# Altium footprint library Components.PcbLib: 260 footprints (part 6 of 17)
Each footprint in its own frame and in the unit in brackets; x right, y up, seen from the top. Pads: shape width x height; smd on the part's side, far side on the other; paste and mask are expansions set on the pad; w line width, h text height; cw(c..) or ccw(c..) is an arc to the next point about the centre after c.
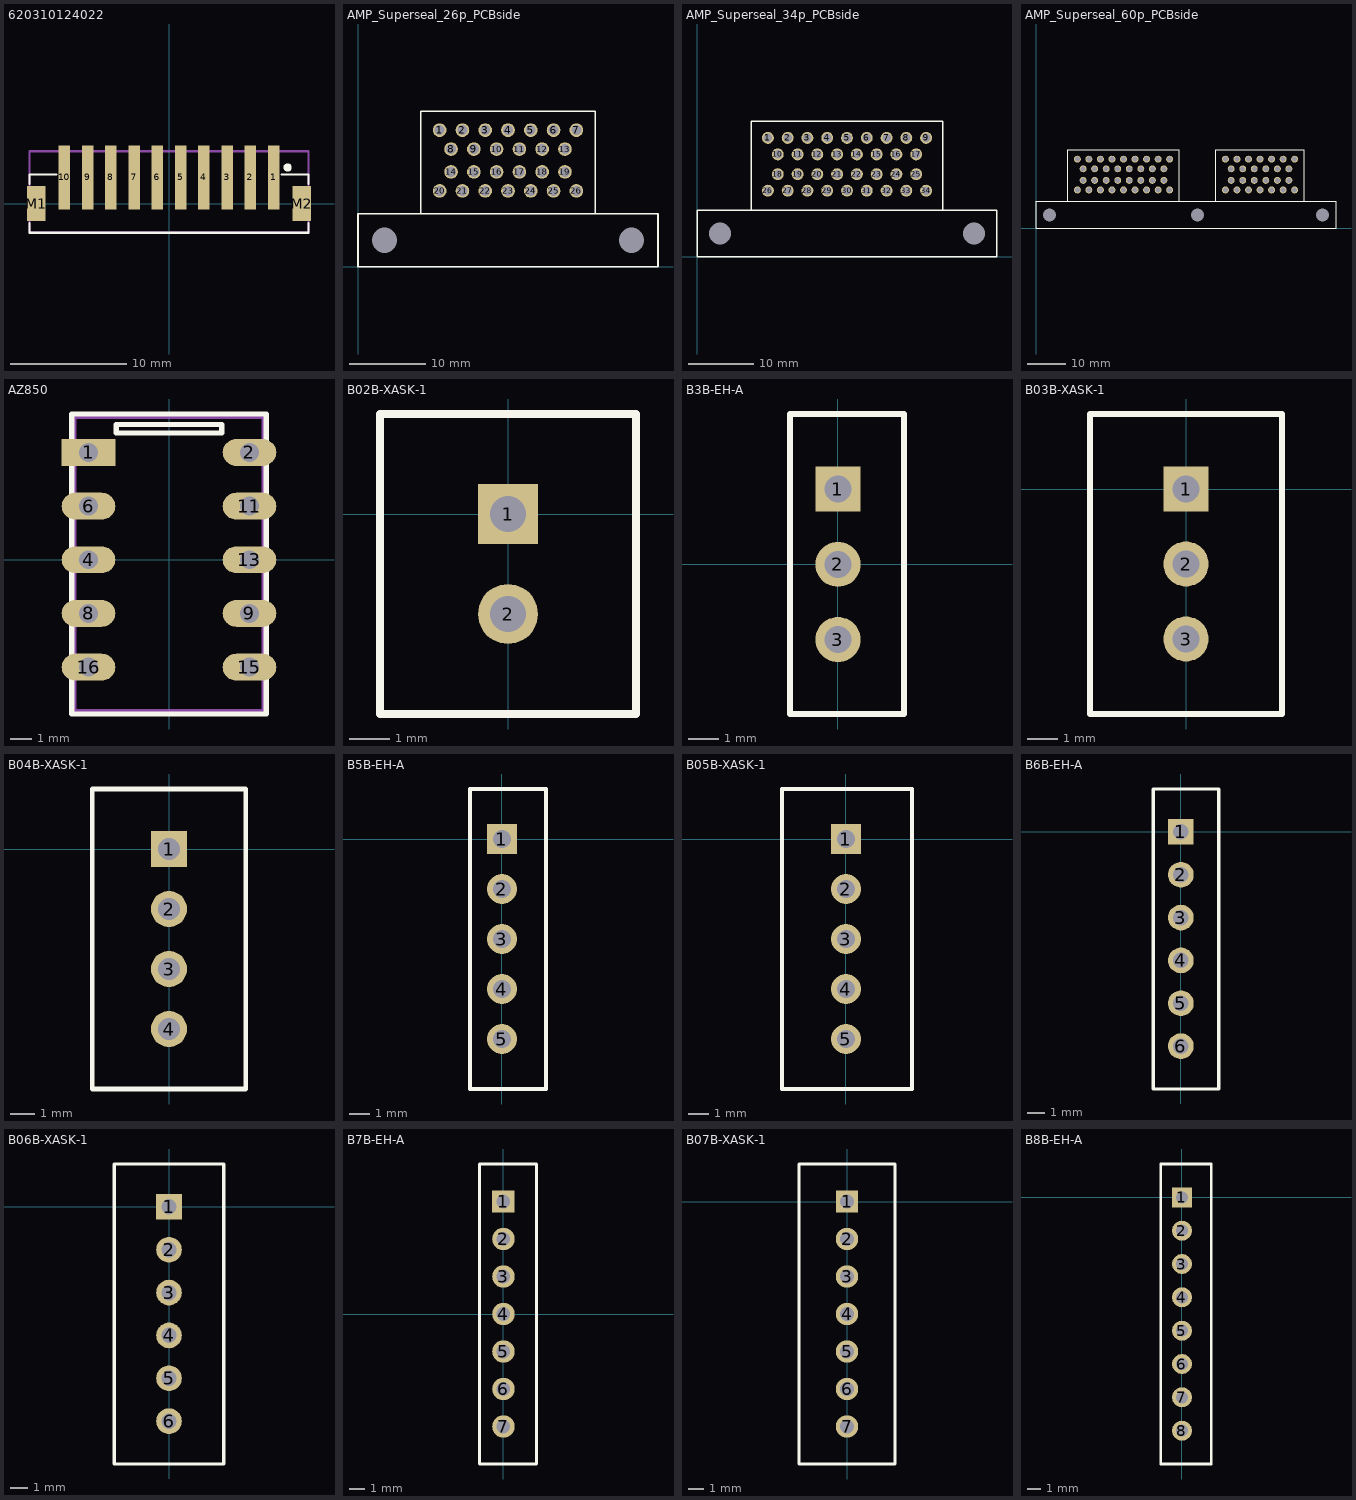
[diagram p5: the footprints below, top view; thin cyan lines are the x and y axes]

## 620310124022 [mm] "2.00mm SMT Male Vertical Shrouded Header, 10p"
height 6.86
pads (12):
  rect 1x5.5 smd: 1(9,2.25) 2(7,2.25) 3(5,2.25) 4(3,2.25) 5(1,2.25) 6(-1,2.25) 7(-3,2.25) 8(-5,2.25) 9(-7,2.25) 10(-9,2.25)
  rect 1.6x3 smd: M1(-11.4,0) M2(11.4,0)
Top Overlay:
  circle w0.5: c10.2,3.1 r0.1
  lines w0.2: -12,-1.7 -12,-2.5 12,-2.5 12,-1.7 ; -12,1.7 -12,2.5 -9.7,2.5 ; 9.7,2.5 12,2.5 12,1.7
Mechanical 13:
  lines w0.2: -12,-2.5 -12,4.5 12,4.5 12,-2.5 -12,-2.5
3D body "620310124022.stp": height 6.75, standoff -0.03, extent -12,-2.5 12,4.51

## AMP_Superseal_26p_PCBside [mm]
pads (28):
  round 1.8 hole 1.3: 1(10.75,18) 2(13.75,18) 3(16.75,18) 4(19.75,18) 5(22.75,18) 6(25.75,18) 7(28.75,18) 8(12.25,15.5) 9(15.25,15.5) 10(18.25,15.5) 11(21.25,15.5) 12(24.25,15.5) 13(27.25,15.5) 14(12.25,12.5) 15(15.25,12.5) 16(18.25,12.5) 17(21.25,12.5) 18(24.25,12.5) 19(27.25,12.5) 20(10.75,10) 21(13.75,10) 22(16.75,10) 23(19.75,10) 24(22.75,10) 25(25.75,10) 26(28.75,10)
  round 0 hole 3.3: MH(3.5,3.5) MH(36,3.5)
Top Overlay:
  lines w0.2: 8.25,7 8.25,20.5 31.25,20.5 31.25,7 ; 0,0 39.5,0 39.5,7 0,7 0,0
3D body "superseal_26p_black.stp": height 27.9, standoff -4, extent 0.025,-16.05 39.525,20.45

## AMP_Superseal_34p_PCBside [mm]
pads (36):
  round 1.8 hole 1.3: 1(10.75,18) 2(13.75,18) 3(16.75,18) 4(19.75,18) 5(22.75,18) 6(25.75,18) 7(28.75,18) 8(31.75,18) 9(34.75,18) 10(12.25,15.5) 11(15.25,15.5) 12(18.25,15.5) 13(21.25,15.5) 14(24.25,15.5) 15(27.25,15.5) 16(30.25,15.5) 17(33.25,15.5) 18(12.25,12.5) 19(15.25,12.5) 20(18.25,12.5) 21(21.25,12.5) 22(24.25,12.5) 23(27.25,12.5) 24(30.25,12.5) 25(33.25,12.5) 26(10.75,10) 27(13.75,10) 28(16.75,10) 29(19.75,10) 30(22.75,10) 31(25.75,10) 32(28.75,10) 33(31.75,10) 34(34.75,10)
  round 0 hole 3.3: MH(3.5,3.5) MH(42,3.5)
Top Overlay:
  lines w0.2: 8.25,7 8.25,20.5 37.25,20.5 37.25,7 ; 0,0 0,7 45.5,7 45.5,0 0,0
3D body "c-6437288-1-c-3d.stp": height 28.17, standoff -3.98, extent 0,-16 45.5,20.5

## AMP_Superseal_60p_PCBside [mm]
pads (63):
  round 1.8 hole 1.3: 1(10.75,18) 2(13.75,18) 3(16.75,18) 4(19.75,18) 5(22.75,18) 6(25.75,18) 7(28.75,18) 8(31.75,18) 9(34.75,18) 10(12.25,15.5) 11(15.25,15.5) 12(18.25,15.5) 13(21.25,15.5) 14(24.25,15.5) 15(27.25,15.5) 16(30.25,15.5) 17(33.25,15.5) 18(12.25,12.5) 19(15.25,12.5) 20(18.25,12.5) 21(21.25,12.5) 22(24.25,12.5) 23(27.25,12.5) 24(30.25,12.5) 25(33.25,12.5) 26(10.75,10) 27(13.75,10) 28(16.75,10) 29(19.75,10) 30(22.75,10) 31(25.75,10) 32(28.75,10) 33(31.75,10) 34(34.75,10) 35(49.25,18) 36(52.25,18) 37(55.25,18) 38(58.25,18) 39(61.25,18) 40(64.25,18) 41(67.25,18) 42(50.75,15.5) 43(53.75,15.5) 44(56.75,15.5) 45(59.75,15.5) 46(62.75,15.5) 47(65.75,15.5) 48(50.75,12.5) 49(53.75,12.5) 50(56.75,12.5) 51(59.75,12.5) 52(62.75,12.5) 53(65.75,12.5) 54(49.25,10) 55(52.25,10) 56(55.25,10) 57(58.25,10) 58(61.25,10) 59(64.25,10) 60(67.25,10)
  round 0 hole 3.3: MH(3.5,3.5) MH(42,3.5) MH(74.5,3.5)
Top Overlay:
  lines w0.2: 8.25,7 8.25,20.5 37.25,20.5 37.25,7 ; 46.75,7 46.75,20.5 69.75,20.5 69.75,7 ; 0,0 0,7 46,7 78,7 78,0 38.5,0 0,0
3D body "c-6437288-3-d-3d.stp": height 28.17, standoff -3.98, extent 0,-16 78,20.5

## AZ850 [mil]
pads (10):
  rect 100x50 hole 35: 1(-150,200)
  oval 100x50 hole 35: 2(150,200) 4(-150,0) 6(-150,100) 8(-150,-100) 9(150,-100) 11(150,100) 13(150,0) 15(150,-200) 16(-150,-200)
Top Overlay:
  lines w10: -181.1,-287.4 -181.1,271.65 181.1,271.65 181.1,-287.4 -181.1,-287.4 ; -98.43,236.22 98.43,236.22 98.43,251.97 -98.43,251.97 -98.43,236.22
Mechanical 1:
  lines w10: -177.17,-283.46 177.17,-283.46 177.17,267.72 -177.17,267.72 -177.17,-283.46
3D body: height 0, standoff -137.8, extent 130.32,-219.66 169.69,-180.33
3D body: height 0, standoff -137.8, extent 130.32,-119.66 169.69,-80.33
3D body: height 0, standoff -137.8, extent 130.32,-19.66 169.69,19.67
3D body: height 0, standoff -137.8, extent 130.32,80.34 169.69,119.67
3D body: height 0, standoff -137.8, extent 130.32,180.34 169.69,219.67
3D body: height 0, standoff -137.8, extent -169.68,-219.66 -130.31,-180.33
3D body: height 0, standoff -137.8, extent -169.68,-119.66 -130.31,-80.33
3D body: height 0, standoff -137.8, extent -169.68,-19.66 -130.31,19.67
3D body: height 0, standoff -137.8, extent -169.68,80.34 -130.31,119.67
3D body: height 0, standoff -137.8, extent -169.68,180.34 -130.31,219.67
3D body: height 196.85, standoff 0, extent -177.17,-283.46 177.17,267.72

## B02B-XASK-1 [mm]
height 8.8
pads (2):
  rect 1.5x1.5 hole 0.9: 1(0,0)
  round 1.5 hole 0.9: 2(0,-2.5)
Top Overlay:
  lines w0.2: -3.2,-5 -3.2,2.5 3.2,2.5 3.2,-5 -3.2,-5
3D body "B02B-XASK-1.STEP": height 8.8, standoff -3.4, extent -3.2,-5 3.2,2.5

## B3B-EH-A [mm]
pads (3):
  rect 1.5x1.5 hole 0.9: 1(0,2.5)
  round 1.5 hole 0.9: 2(0,0) 3(0,-2.5)
Top Overlay:
  lines w0.2: -1.6,-4.975 2.2,-4.975 2.2,5 -1.6,5 -1.6,-4.975

## B03B-XASK-1 [mm]
height 8.8
pads (3):
  rect 1.5x1.5 hole 0.9: 1(0,0)
  round 1.5 hole 0.9: 2(0,-2.5) 3(0,-5)
Top Overlay:
  lines w0.2: -3.2,-7.5 3.2,-7.5 3.2,2.5 -3.2,2.5 -3.2,-7.5
3D body "B03B-XASK-1.STEP": height 8.8, standoff -3.4, extent -3.2,-7.5 3.2,2.5

## B04B-XASK-1 [mm]
height 8.8
pads (4):
  rect 1.5x1.5 hole 0.9: 1(0,0)
  round 1.5 hole 0.9: 2(0,-2.5) 3(0,-5) 4(0,-7.5)
Top Overlay:
  lines w0.2: -3.2,-10 3.2,-10 3.2,2.5 -3.2,2.5 -3.2,-10
3D body "B04B-XASK-1.STEP": height 8.8, standoff -3.4, extent -3.2,-10 3.2,2.5

## B5B-EH-A [mm]
height 8.8
pads (5):
  rect 1.5x1.5 hole 0.9: 1(0,0)
  round 1.5 hole 0.9: 2(0,-2.5) 3(0,-5) 4(0,-7.5) 5(0,-10)
Top Overlay:
  lines w0.2: -1.6,-12.5 2.2,-12.5 2.2,2.5 -1.6,2.5 -1.6,-12.5
3D body "B5B-EH-A.STEP": height 6, standoff -3.2, extent -1.6,-12.5 2.2,2.5

## B05B-XASK-1 [mm]
height 8.8
pads (5):
  rect 1.5x1.5 hole 0.9: 1(0,0)
  round 1.5 hole 0.9: 2(0,-2.5) 3(0,-5) 4(0,-7.5) 5(0,-10)
Top Overlay:
  lines w0.2: -3.2,-12.5 3.302,-12.5 3.302,2.5 -3.2,2.5 -3.2,-12.5
3D body "B05B-XASK-1.STEP": height 2.9, standoff -9.3, extent -3.225,-12.58 3.175,2.42

## B6B-EH-A [mm]
height 8.8
pads (6):
  rect 1.5x1.5 hole 0.9: 1(0,0)
  round 1.5 hole 0.9: 2(0,-2.5) 3(0,-5) 4(0,-7.5) 5(0,-10) 6(0,-12.5)
Top Overlay:
  lines w0.2: -1.6,-15 2.2,-15 2.2,2.5 -1.6,2.5 -1.6,-15
3D body "B6B-EH-A.STEP": height 6, standoff -3.2, extent -1.6,-15 2.2,2.5

## B06B-XASK-1 [mm]
height 8.8
pads (6):
  rect 1.5x1.5 hole 0.9: 1(0,0)
  round 1.5 hole 0.9: 2(0,-2.5) 3(0,-5) 4(0,-7.5) 5(0,-10) 6(0,-12.5)
Top Overlay:
  lines w0.2: -3.2,-15 3.2,-15 3.2,2.5 -3.2,2.5 -3.2,-15
3D body "B06B-XASK-1.STEP": height 8.8, standoff -3.4, extent -3.2,-15 3.2,2.5

## B7B-EH-A [mm]
height 8.8
pads (7):
  rect 1.5x1.5 hole 0.9: 1(0,7.5)
  round 1.5 hole 0.9: 2(0,5) 3(0,2.5) 4(0,0) 5(0,-2.5) 6(0,-5)
  round 1.5 hole 0.9 mask+0.102: 7(0,-7.5)
Top Overlay:
  lines w0.2: -1.6,-10 -1.6,10 2.2,10 2.2,-10 -1.6,-10

## B07B-XASK-1 [mm]
height 8.8
pads (7):
  rect 1.5x1.5 hole 0.9: 1(0,0)
  round 1.5 hole 0.9: 2(0,-2.5) 3(0,-5) 4(0,-7.5) 5(0,-10) 6(0,-12.5) 7(0,-15)
Top Overlay:
  lines w0.2: -3.2,-17.5 3.2,-17.5 3.2,2.5 -3.2,2.5 -3.2,-17.5
3D body "B07B-XASK-1.STEP": height 8.8, standoff -3.4, extent -3.2,-17.5 3.2,2.5

## B8B-EH-A [mm]
height 8.8
pads (8):
  rect 1.5x1.5 hole 0.9: 1(0,0)
  round 1.5 hole 0.9: 2(0,-2.5) 3(0,-5) 4(0,-7.5) 5(0,-10) 6(0,-12.5) 7(0,-15) 8(0,-17.5)
Top Overlay:
  lines w0.2: -1.6,-20 -1.6,2.5 2.2,2.5 2.2,-20 -1.6,-20
3D body "B8B-EH-A.STEP": height 6, standoff -3.2, extent -1.6,-20 2.2,2.5